# Altium footprint library Inductor.PcbLib: 25 footprints (part 1 of 2)
Each footprint in its own frame and in the unit in brackets; x right, y up, seen from the top. Pads: shape width x height; smd on the part's side, far side on the other; paste and mask are expansions set on the pad; w line width, h text height; cw(c..) or ccw(c..) is an arc to the next point about the centre after c.
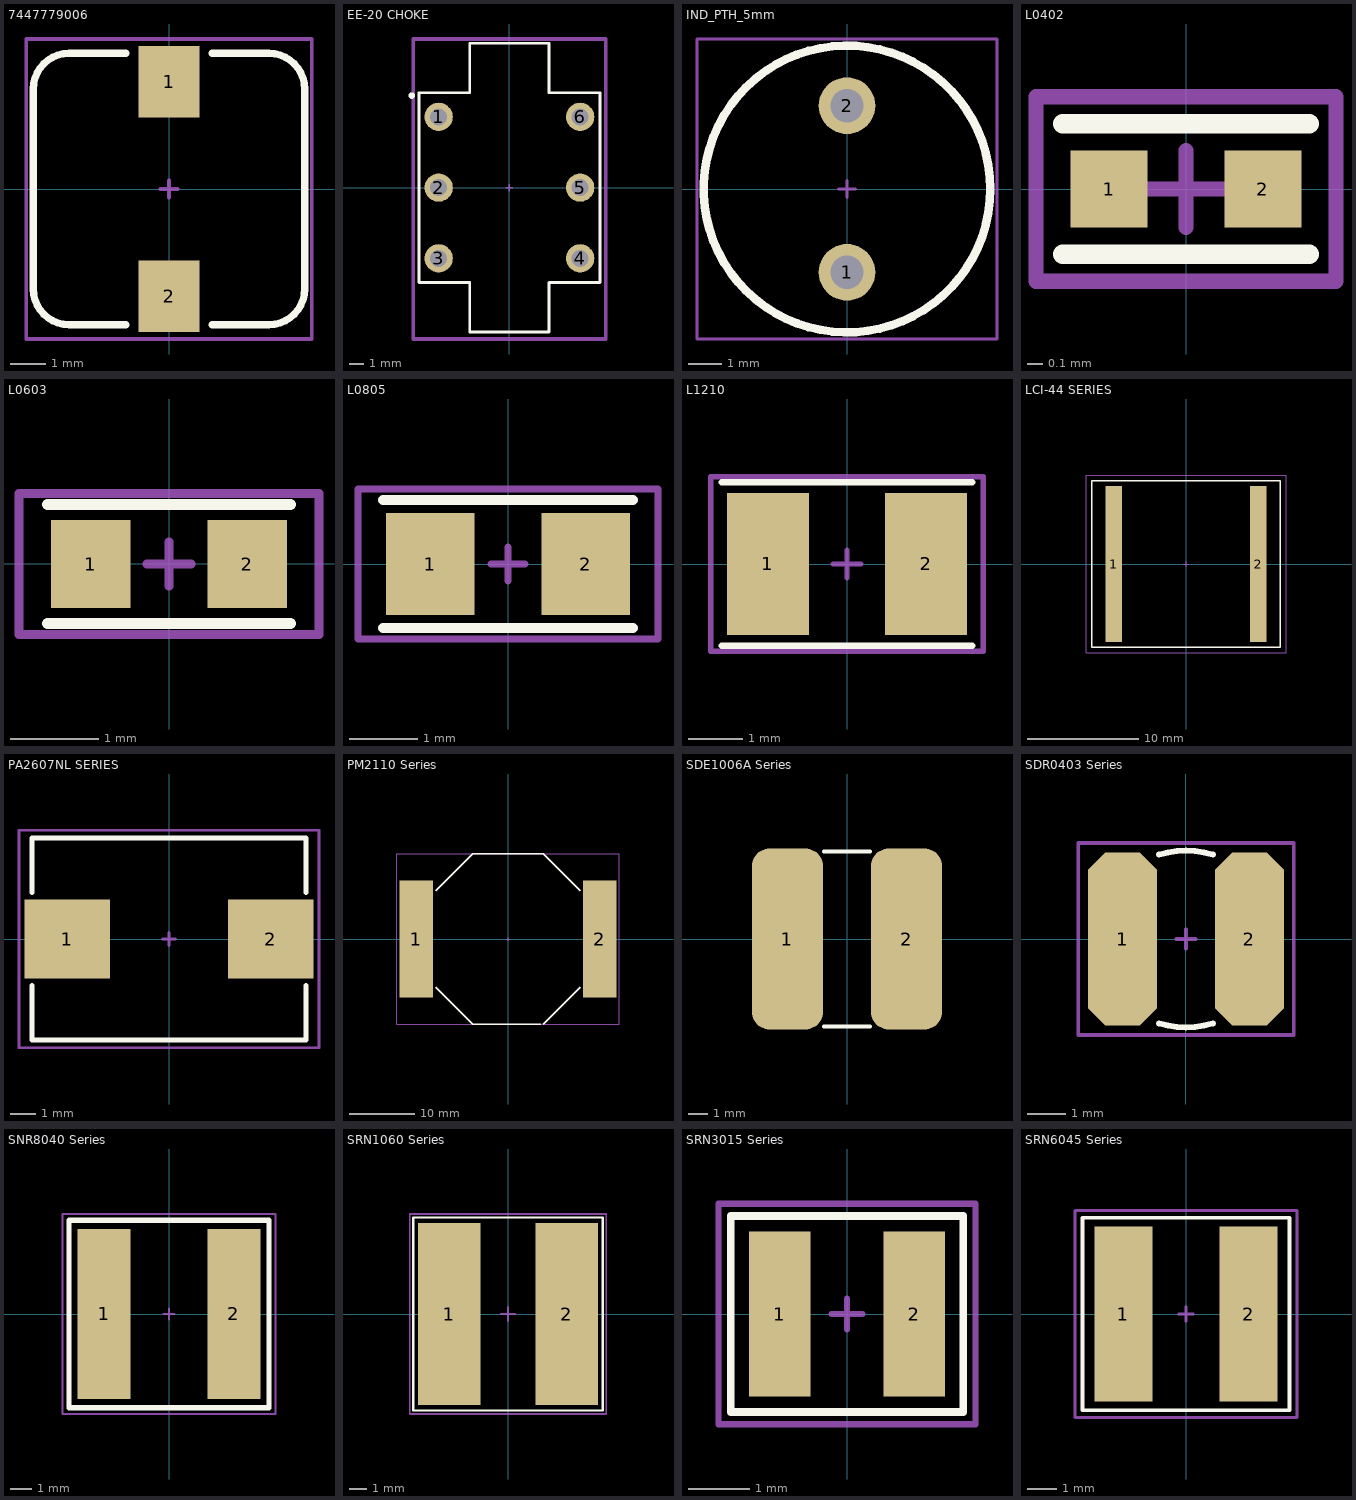
[diagram p0: the footprints below, top view; thin cyan lines are the x and y axes]

## 7447779006 [mm] "SRN8040 Series Inductor Package"
height 4.5
pads (2):
  rect 1.7x2 smd: 1(0,3) 2(0,-3)
Top Overlay:
  lines w0.2: -1.2,-3.8 -2.8,-3.8 cw(c-2.8,-2.8) -3.8,-2.8 -3.8,2.8 cw(c-2.8,2.8) -2.8,3.8 -1.2,3.8 ; 1.2,-3.8 2.8,-3.8 ccw(c2.8,-2.8) 3.8,-2.8 3.8,2.8 ccw(c2.8,2.8) 2.8,3.8 1.2,3.8
Mechanical 15:
  lines w0.1: -0.25,0 0.25,0 ; 0,-0.25 0,0.25 ; -4,-4.2 -4,4.2 4,4.2 4,-4.2 -4,-4.2
3D body "WE-PD Series 7.3x7.3x4.5mm.STEP": height 4.6, standoff 0, extent -3.65,-3.65 3.65,3.65

## EE-20 CHOKE [mm] "E-25-10T-V-Long"
height 20
pads (6):
  round 2 hole 1.2: 1(-5,5) 2(-5,0) 3(-5,-5) 4(5,-5) 5(5,0) 6(5,5)
Top Overlay:
  circle w0.254: c-6.9,6.5 r0.1
  lines w0.2: -6.4,-6.7 -6.4,6.7 -2.8,6.7 -2.8,10.2 2.8,10.2 2.8,6.7 6.4,6.7 6.4,-6.7 2.8,-6.7 2.8,-10.2 -2.8,-10.2 -2.8,-6.7 -6.4,-6.7
Mechanical 15:
  lines w0.1: -0.25,0 0.25,0 ; 0,-0.25 0,0.25
  lines w0.254: -6.8,-10.7 6.8,-10.7 6.8,10.5 -6.8,10.5 -6.8,-10.7
3D body "Trafo EE20 - Copia.STEP": height 20.3, standoff -3.1, extent -6,-10 6,10

## IND_PTH_5mm [mm]
height 3.2
pads (2):
  round 1.7 hole 1: 1(0,-2.5) 2(0,2.5)
Top Overlay:
  circle w0.254: c0,0 r4.3
Mechanical 15:
  lines w0.1: -0.25,0 0.25,0 ; 0,-0.25 0,0.25 ; -4.5,-4.5 -4.5,4.5 4.5,4.5 4.5,-4.5 -4.5,-4.5
3D body "User Library-CT187LY-271.step": height 11.2, standoff -5, extent -4.15,-4.15 4.15,4.15

## L0402 [mm]
height 0.6
pads (2):
  rect 0.5x0.5 smd: 1(-0.5,0) 2(0.5,0)
Top Overlay:
  lines w0.127: -0.8,-0.425 0.8,-0.425 ; -0.8,0.425 0.8,0.425
Mechanical 15:
  lines w0.1: -0.25,0 0.25,0 ; 0,-0.25 0,0.25 ; -0.975,-0.6 -0.975,0.6 0.975,0.6 0.975,-0.6 -0.975,-0.6
3D body "User Library-Chip Inductor.step": height 0.6, standoff 0, extent -0.5,-0.25 0.5,0.25

## L0603 [mm]
pads (2):
  rect 0.9x1 smd: 1(-0.889,0) 2(0.889,0)
Top Overlay:
  lines w0.127: -1.375,-0.675 1.375,-0.675 ; -1.375,0.675 1.375,0.675
Mechanical 15:
  lines w0.1: -0.25,0 0.25,0 ; 0,-0.25 0,0.25 ; -1.7,-0.8 1.7,-0.8 1.7,0.8 -1.7,0.8 -1.7,-0.8
3D body "User Library-Chip Inductor (1).step": height 0.95, standoff 0, extent -0.8,-0.4 0.8,0.4

## L0805 [mm]
pads (2):
  rect 1.3x1.5 smd: 1(-1.143,0) 2(1.143,0)
Top Overlay:
  lines w0.15: -1.829,-0.94 1.829,-0.94 ; -1.829,0.94 1.829,0.94
Mechanical 15:
  lines w0.1: -0.25,0 0.25,0 ; 0,-0.25 0,0.25 ; -2.2,-1.1 2.2,-1.1 2.2,1.1 -2.2,1.1 -2.2,-1.1
3D body "User Library-Chip Inductor (2).step": height 0.95, standoff 0, extent -1,-0.6 1,0.6

## L1210 [mm]
pads (2):
  rect 1.5x2.6 smd: 1(-1.45,0) 2(1.45,0)
Top Overlay:
  lines w0.12: -2.3,-1.5 2.3,-1.5 ; -2.3,1.5 2.3,1.5
Mechanical 15:
  lines w0.1: -0.25,0 0.25,0 ; 0,-0.25 0,0.25 ; -2.5,-1.6 2.5,-1.6 2.5,1.6 -2.5,1.6 -2.5,-1.6
3D body "User Library-Chip Inductor.step": height 1.35, standoff 0, extent -1.6,-1.25 1.6,1.25

## LCI-44 SERIES [mm]
height 16
pads (2):
  rect 1.5x14 smd: 1(-6.5,0) 2(6.5,0)
Top Overlay:
  lines w0.127: -8.5,-7.5 -8.5,7.5 8.5,7.5 8.5,-7.5 -8.5,-7.5
Mechanical 15:
  lines w0.1: -0.25,0 0.25,0 ; 0,-0.25 0,0.25 ; -9,-8 -9,8 9,8 9,-8 -9,-8
3D body "LCI-44 SERIES.STEP": height 11.35, standoff 0.05, extent -8,-7.5 8,7.5

## PA2607NL SERIES [mm] "PA2607NL Series Inductor Package"
height 7.65
pads (2):
  rect 3.3x3.05 smd: 1(-3.935,0) 2(3.935,0)
Top Overlay:
  lines w0.2: -5.3,-1.8 -5.3,-1.9 -5.3,-3.9 5.3,-3.9 5.3,-1.8 ; -5.3,1.8 -5.3,3.9 5.3,3.9 5.3,1.9 5.3,1.8
Mechanical 15:
  lines w0.1: -0.25,0 0.25,0 ; 0,-0.25 0,0.25 ; -5.8,-4.2 5.8,-4.2 5.8,4.2 -5.8,4.2 -5.8,-4.2
3D body "PA2607NL Series.STEP": height 7.5, standoff 0, extent -5.15,-3.825 5.15,3.825

## PM2110 Series [mm] "PM2110 Series Inductor Package"
height 11
pads (2):
  rect 5.1x17.8 smd: 1(-14,0) 2(14,0)
Top Overlay:
  lines w0.2: -11.05,-7.35 -5.4,-13 5,-13 ; -11.05,7.35 -5.4,13 -5,13 5.4,13 11.05,7.35 ; 5.4,-13 11.05,-7.35
Mechanical 15:
  lines w0.1: -0.25,0 0.25,0 ; 0,-0.25 0,0.25 ; -17,-13 -17,13 17,13 17,-13 -17,-13
3D body "User Library-Inductor Bourns PM2110 model ST214.STEP": height 16.25, standoff 0, extent -15.3,-12.7 15.3,12.7

## SDE1006A Series [mm] "SMD Power Inductors"
height 5.4
pads (2):
  rrect50% 3.75x9.5 smd: 1(-3.125,0) 2(3.125,0)
Top Overlay:
  lines w0.2: -1.2,-4.6 1.2,-4.6 ; -1.2,4.6 1.2,4.6
3D body "SDE1006A.STEP": height 5.4, standoff 0, extent -4.942,-4.5 4.942,4.5

## SDR0403 Series [mm]
height 3.2
pads (2):
  oct 1.8x4.5 smd: 1(-1.65,0) 2(1.65,0)
Top Overlay:
  lines w0.157: -0.697,-2.192 ccw(c0,0) 0.697,-2.192 ; -0.697,2.192 cw(c0,0) 0.697,2.192
Mechanical 15:
  lines w0.1: -0.25,0 0.25,0 ; 0,-0.25 0,0.25 ; -2.8,-2.5 -2.8,2.5 2.8,2.5 2.8,-2.5 -2.8,-2.5
3D body "Inductor SDR0403 Series.STEP": height 3.25, standoff 0, extent -2.201,-2.25 2.201,2.25

## SNR8040 Series [mm] "SRN8040 Series Inductor Package"
height 4
pads (2):
  rect 2.5x8 smd: 1(-3.05,0) 2(3.05,0)
Top Overlay:
  lines w0.254: -4.7,-4.4 4.7,-4.4 4.7,4.4 -4.7,4.4 -4.7,-4.4
Mechanical 15:
  lines w0.1: -0.25,0 0.25,0 ; 0,-0.25 0,0.25 ; -5,-4.7 5,-4.7 5,4.7 -5,4.7 -5,-4.7
3D body "Inductor SRN8040 Series.STEP": height 4, standoff 0, extent -4.009,-4 4.009,4

## SRN1060 Series [mm]
height 1.5
pads (2):
  rect 3.5x10.2 smd: 1(-3.3,0) 2(3.3,0)
Top Overlay:
  lines w0.127: -5.3,-5.4 5.3,-5.4 5.3,5.4 -5.3,5.4 -5.3,-5.4
Mechanical 15:
  lines w0.1: -0.4,0 0.4,0 ; 0,-0.4 0,0.4 ; -5.5,-5.6 5.5,-5.6 5.5,5.6 -5.5,5.6 -5.5,-5.6
3D body "User Library-SRN1060.STEP": height 6.1, standoff 0, extent -4.9,-5 4.9,5

## SRN3015 Series [mm]
height 1.5
pads (2):
  rect 1x2.7 smd: 1(-1.1,0) 2(1.1,0)
Top Overlay:
  lines w0.127: -1.9,-1.6 -1.9,1.6 1.9,1.6 1.9,-1.6 -1.9,-1.6
Mechanical 15:
  lines w0.1: -0.25,0 0.25,0 ; 0,-0.25 0,0.25 ; -2.1,-1.8 -2.1,1.8 2.1,1.8 2.1,-1.8 -2.1,-1.8
3D body "Inductor SRN3015 Series.STEP": height 1.5, standoff 0, extent -1.51,-1.362 1.51,1.362

## SRN6045 Series [mm]
height 1.5
pads (2):
  rect 2x6 smd: 1(-2.15,0) 2(2.15,0)
Top Overlay:
  lines w0.127: -3.556,-3.302 -3.556,3.302 3.556,3.302 3.556,-3.302 -3.556,-3.302
Mechanical 15:
  lines w0.1: -0.25,0 0.25,0 ; 0,-0.25 0,0.25 ; -3.81,-3.556 -3.81,3.556 3.81,3.556 3.81,-3.556 -3.81,-3.556
3D body "SRN6045 Series.STEP": height 4.5, standoff 0, extent -3.15,-3 3.15,3